# Altium footprint library Altium_Lib.PcbLib: 334 footprints (part 6 of 21)
Each footprint in its own frame and in the unit in brackets; x right, y up, seen from the top. Pads: shape width x height; smd on the part's side, far side on the other; paste and mask are expansions set on the pad; w line width, h text height; cw(c..) or ccw(c..) is an arc to the next point about the centre after c.
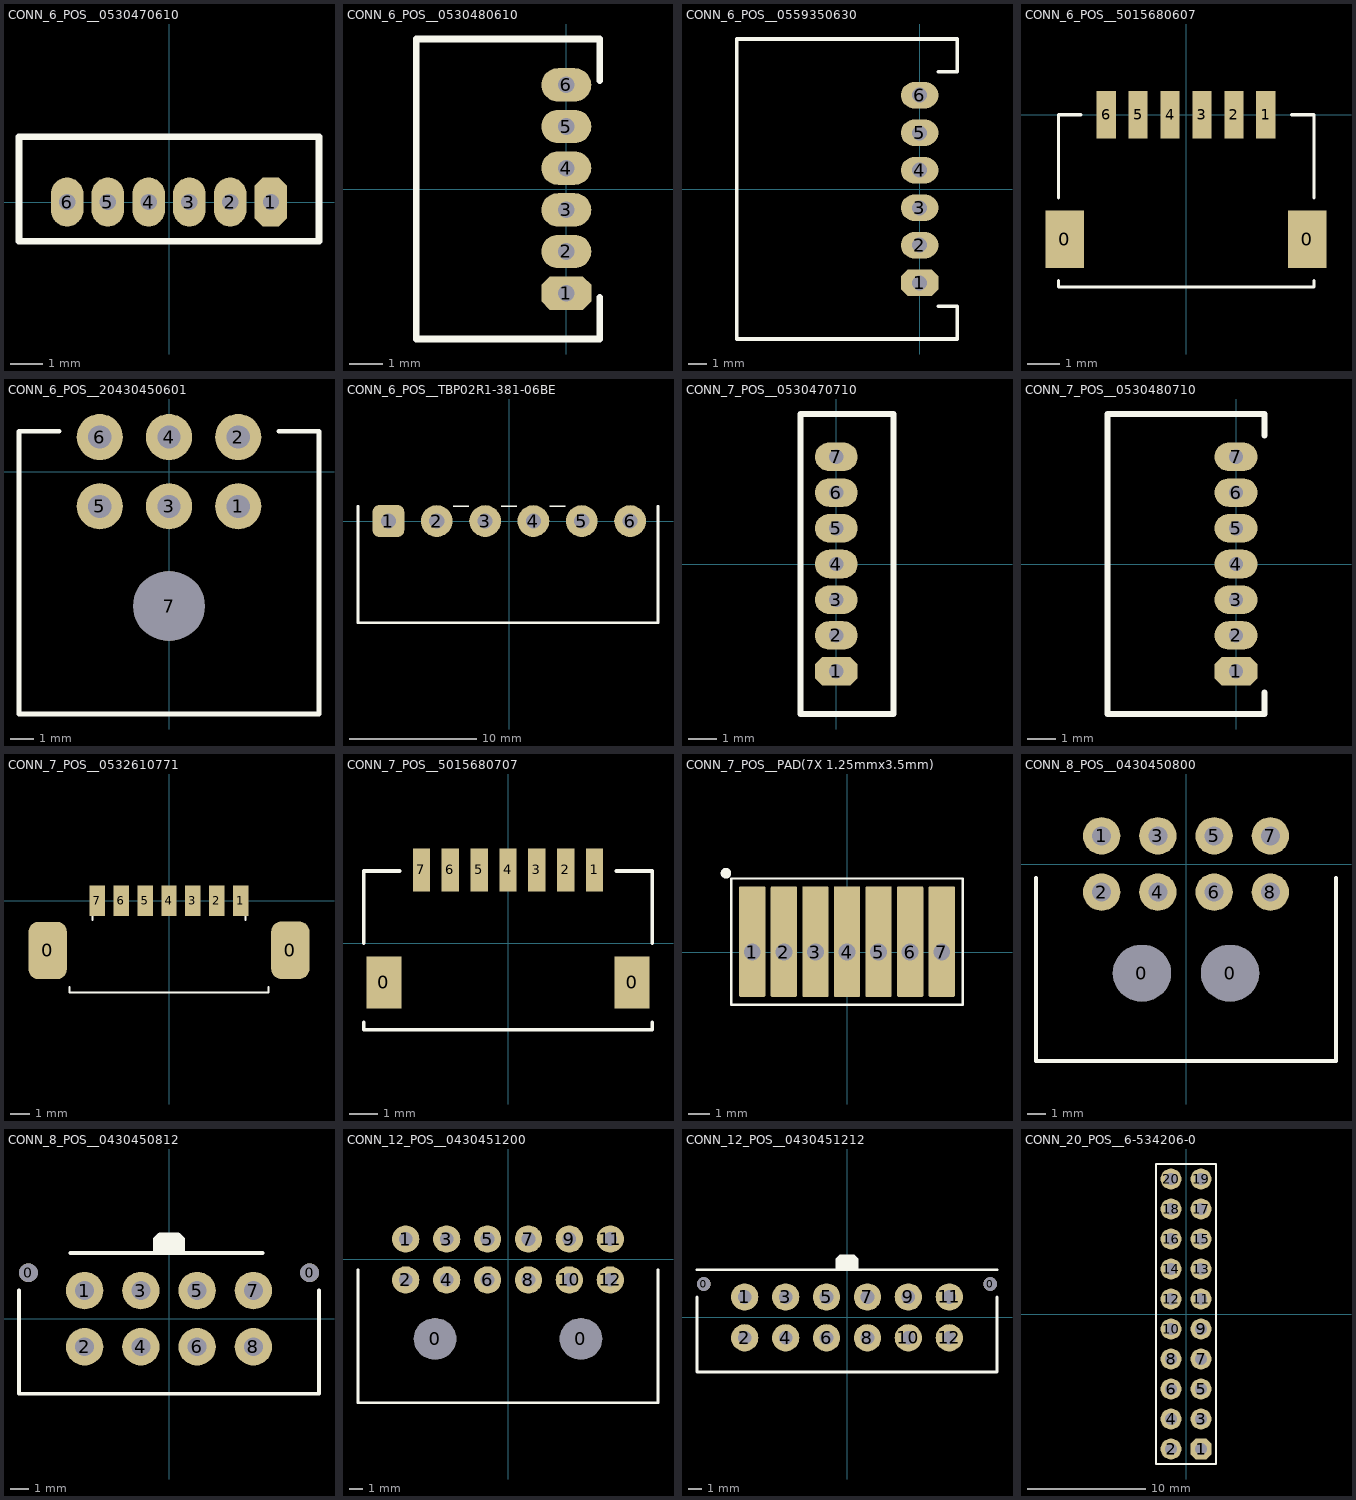
[diagram p5: the footprints below, top view; thin cyan lines are the x and y axes]

## CONN_6_POS__0530470610 [mm]
pads (6):
  oct 1x1.5 hole 0.5: 1(3.125,0)
  oval 1x1.5 hole 0.5: 2(1.875,0) 3(0.625,0) 4(-0.625,0) 5(-1.875,0) 6(-3.125,0)
Top Overlay:
  lines w0.2: -4.6,-1.2 -4.6,2 4.6,2 4.6,-1.2 -4.6,-1.2
3D body "530470610.stp": height 4.18, standoff -2.32, extent -4.625,-1.175 4.625,2.025

## CONN_6_POS__0530480610 [mm]
pads (6):
  oct 1.5x1 hole 0.5: 1(0,-3.125)
  oval 1.5x1 hole 0.5: 2(0,-1.875) 3(0,-0.625) 4(0,0.625) 5(0,1.875) 6(0,3.125)
Top Overlay:
  lines w0.2: 1,-3.25 1,-4.5 -4.5,-4.5 -4.5,4.5 1,4.5 1,3.25
3D body "530480610.stp": height 3.6, standoff -2.2, extent -4.475,-4.625 1.025,4.625

## CONN_6_POS__0559350630 [mm]
pads (6):
  oct 2x1.4 hole 0.8: 1(0,-5)
  oval 2x1.4 hole 0.8: 2(0,-3) 3(0,-1) 4(0,1) 5(0,3) 6(0,5)
Top Overlay:
  lines w0.2: 1,-6.25 2,-6.25 2,-8 -9.75,-8 -9.75,8 2,8 2,6.25 1,6.25
3D body "559350630.stp": height 6.7, standoff -3.2, extent -9.675,-8.05 2.075,7.95

## CONN_6_POS__5015680607 [mil]
pads (8):
  rect 47.24x70.87 smd: 0(-149.92,-153.54) 0(149.29,-153.54)
  rect 23.62x59.06 smd: 1(98.11,0) 2(58.74,0) 3(19.37,0) 4(-20,0) 5(-59.37,0) 6(-98.74,0)
Top Overlay:
  lines w3.94: -157.48,-204.72 -157.48,-212.6 157.48,-212.6 157.48,-204.72 ; -157.48,-102.36 -157.48,0 -129.92,0 ; 129.92,0 157.48,0 157.48,-102.36
3D body "5015680607.stp": height 185.04, standoff 0, extent -157.47,-211.61 157.49,20.68

## CONN_6_POS__20430450601 [mm]
pads (7):
  round 2 hole 1: 1(3,-1.5) 2(3,1.5) 3(0,-1.5) 4(0,1.5) 5(-3,-1.5) 6(-3,1.5)
  round 3 hole 3 slot 3.1 at 0 deg: 7(0,-5.82)
Top Overlay:
  lines w0.2: -4.75,1.75 -6.5,1.75 -6.5,-10.5 6.5,-10.5 6.5,1.75 4.75,1.75
3D body "430450601.stp": height 8.83, standoff -3.12, extent -6.575,-10.45 6.575,1.79

## CONN_6_POS__TBP02R1-381-06BE [mm] "Connector; Header; 6 Position"
height 8.5
pads (6):
  rrect40% 2.5x2.5 hole 1.2: 1(-9.525,0)
  round 2.5 hole 1.2: 2(-5.715,0) 3(-1.905,0) 4(1.905,0) 5(5.715,0) 6(9.525,0)
Top Overlay:
  lines w0.1: -4.425,1.15 -3.2,1.15 ; -0.625,1.15 0.6,1.15 ; 3.175,1.15 4.4,1.15
  lines w0.2: -11.925,1.15 -11.925,-8.025 11.725,-8.025 11.725,1.15
3D body "CUI_DEVICES_TBP02R1-381-06BE.STEP": height 7.3, standoff -3.4, extent -11.9,-8.05 11.75,1.15

## CONN_7_POS__0530470710 [mm]
pads (7):
  oct 1.5x1 hole 0.5: 1(0,-3.75)
  oval 1.5x1 hole 0.5: 2(0,-2.5) 3(0,-1.25) 4(0,0) 5(0,1.25) 6(0,2.5) 7(0,3.75)
Top Overlay:
  lines w0.2: -1.25,-5.25 2,-5.25 2,5.25 -1.25,5.25 -1.25,-5.25
3D body "530470710.stp": height 4.28, standoff -2.22, extent -1.175,-5.25 2.025,5.25

## CONN_7_POS__0530480710 [mm]
pads (7):
  oct 1.5x1 hole 0.5: 1(0,-3.75)
  oval 1.5x1 hole 0.5: 2(0,-2.5) 3(0,-1.25) 4(0,0) 5(0,1.25) 6(0,2.5) 7(0,3.75)
Top Overlay:
  lines w0.2: 1,-4.5 1,-5.25 -4.5,-5.25 -4.5,5.25 1,5.25 1,4.5
3D body "530480710.stp": height 3.6, standoff -2.2, extent -4.475,-5.25 1.025,5.25

## CONN_7_POS__0532610771 [mm]
pads (9):
  rrect50% 2x3 smd: 0(-6.35,-2.6) 0(6.35,-2.588)
  rect 0.8x1.6 smd: 1(3.75,0) 2(2.5,0) 3(1.25,0) 4(0,0) 5(-1.25,0) 6(-2.5,0) 7(-3.75,0)
Top Overlay:
  lines w0.1: -5.2,-4.5 -5.2,-4.8 -5.147,-4.8 5.1,-4.8 5.2,-4.8 5.2,-4.5 ; -4,-1 -4,-0.5 -3.5,-0.5 ; 3.5,-0.5 4,-0.5 4,-1
3D body "532610771.stp": height 3.45, standoff 0.05, extent -6.95,-4.725 6.95,0.475

## CONN_7_POS__5015680707 [mm]
pads (9):
  rect 1.2x1.8 smd: 0(-4.3,-1.36) 0(4.3,-1.36)
  rect 0.6x1.5 smd: 1(3,2.54) 2(2,2.54) 3(1,2.54) 4(0,2.54) 5(-1,2.54) 6(-2,2.54) 7(-3,2.54)
Top Overlay:
  lines w0.127: -5,-2.75 -5,-3 5,-3 5,-2.75 ; -5,0 -5,2.5 -3.75,2.5 ; 3.75,2.5 5,2.5 5,0
3D body "5015680707.stp": height 4.7, standoff 0, extent -4.5,-2.925 4.5,2.975

## CONN_7_POS__PAD(7X 1.25mmx3.5mm) [mm]
pads (7):
  rrect10% 1.25x5.25 / inner rrect10% 1.25x3.5 / far side oval 1.25x2.5 hole 0.8 copper offset 0,0.5: 1(-4.5,0) 2(-3,0) 3(-1.5,0) 4(0,0) 5(1.5,0) 6(3,0) 7(4.5,0)
Top Overlay:
  circle w0.25: c-5.75,3.75 r0.125
  lines w0.1: -5.5,-2.5 5.5,-2.5 5.5,3.5 -5.5,3.5 -5.5,-2.5

## CONN_8_POS__0430450800 [mm]
pads (10):
  round 3 hole 3 slot 3.1 at 0 deg: 0(-2.35,-5.82) 0(2.35,-5.82)
  round 2 hole 1: 1(-4.5,1.5) 2(-4.5,-1.5) 3(-1.5,1.5) 4(-1.5,-1.5) 5(1.5,1.5) 6(1.5,-1.5) 7(4.5,1.5) 8(4.5,-1.5)
Top Overlay:
  lines w0.2: -8,-0.75 -8,-10.5 8,-10.5 8,-0.75
3D body "430450800.stp": height 8.93, standoff -3.02, extent -8.075,-10.455 8.075,1.785

## CONN_8_POS__0430450812 [mm]
pads (10):
  round 1 hole 1: 0(-7.5,2.45) 0(7.5,2.45)
  round 2 hole 1: 1(-4.5,1.5) 2(-4.5,-1.5) 3(-1.5,1.5) 4(-1.5,-1.5) 5(1.5,1.5) 6(1.5,-1.5) 7(4.5,1.5) 8(4.5,-1.5)
Top Overlay:
  region: 0.75,3.5 0.75,4.25 0.5,4.5 -0.5,4.5 -0.75,4.25 -0.75,3.5
  lines w0.2: -8,1.5 -8,-4 8,-4 8,1.5 ; -5.25,3.5 5,3.5 ; -0.75,3.5 -0.75,4.25 -0.5,4.5 0.5,4.5 0.75,4.25 0.75,3.75 0.75,3.5
3D body "430450812.stp": height 10.45, standoff -2.64, extent -8.075,-3.985 8.075,4.785

## CONN_12_POS__0430451200 [mm]
pads (14):
  round 3 hole 3 slot 3.1 at 0 deg: 0(-5.35,-5.82) 0(5.35,-5.82)
  round 2 hole 1: 1(-7.5,1.5) 2(-7.5,-1.5) 3(-4.5,1.5) 4(-4.5,-1.5) 5(-1.5,1.5) 6(-1.5,-1.5) 7(1.5,1.5) 8(1.5,-1.5) 9(4.5,1.5) 10(4.5,-1.5) 11(7.5,1.5) 12(7.5,-1.5)
Top Overlay:
  lines w0.2: -11,-0.75 -11,-3.75 -11,-10.5 11,-10.5 11,-3.75 11,-0.75
3D body "430451200.stp": height 9.03, standoff -2.92, extent -11.075,-10.455 11.075,1.785

## CONN_12_POS__0430451212 [mm]
pads (14):
  round 1 hole 1: 0(-10.5,2.45) 0(10.5,2.45)
  round 2 hole 1: 1(-7.5,1.5) 2(-7.5,-1.5) 3(-4.5,1.5) 4(-4.5,-1.5) 5(-1.5,1.5) 6(-1.5,-1.5) 7(1.5,1.5) 8(1.5,-1.5) 9(4.5,1.5) 10(4.5,-1.5) 11(7.5,1.5) 12(7.5,-1.5)
Top Overlay:
  region: 0.75,3.5 0.75,4.25 0.5,4.5 -0.5,4.5 -0.75,4.25 -0.75,3.5
  lines w0.2: -11,1.5 -11,-3.75 -11,-4 11,-4 11,-3.75 11,1.5 ; -11,3.5 11,3.5 ; -0.75,3.5 -0.75,4.25 -0.5,4.5 0.5,4.5 0.75,4.25 0.75,3.75 0.75,3.5
3D body "430451212.stp": height 9.95, standoff -3.14, extent -11.075,-3.94 11.075,4.83

## CONN_20_POS__6-534206-0 [mil]
height 400
pads (20):
  oct 70x70 hole 40: 1(50,-450)
  round 70 hole 40: 2(-50,-450) 3(50,-350) 4(-50,-350) 5(50,-250) 6(-50,-250) 7(50,-150) 8(-50,-150) 9(50,-50) 10(-50,-50) 11(50,50) 12(-50,50) 13(50,150) 14(-50,150) 15(50,250) 16(-50,250) 17(50,350) 18(-50,350) 19(50,450) 20(-50,450)
Top Overlay:
  lines w7.87: -100,-500 -100,500 100,500 100,-500 -100,-500
3D body "c-6-534206-0-n-3d.stp": height 346.46, standoff -108.54, extent -99,-500 99,500